# Altium footprint library ref-packages.PCBLIB: 1543 footprints (part 9 of 103)
Each footprint in its own frame and in the unit in brackets; x right, y up, seen from the top. Pads: shape width x height; smd on the part's side, far side on the other; paste and mask are expansions set on the pad; w line width, h text height; cw(c..) or ccw(c..) is an arc to the next point about the centre after c.
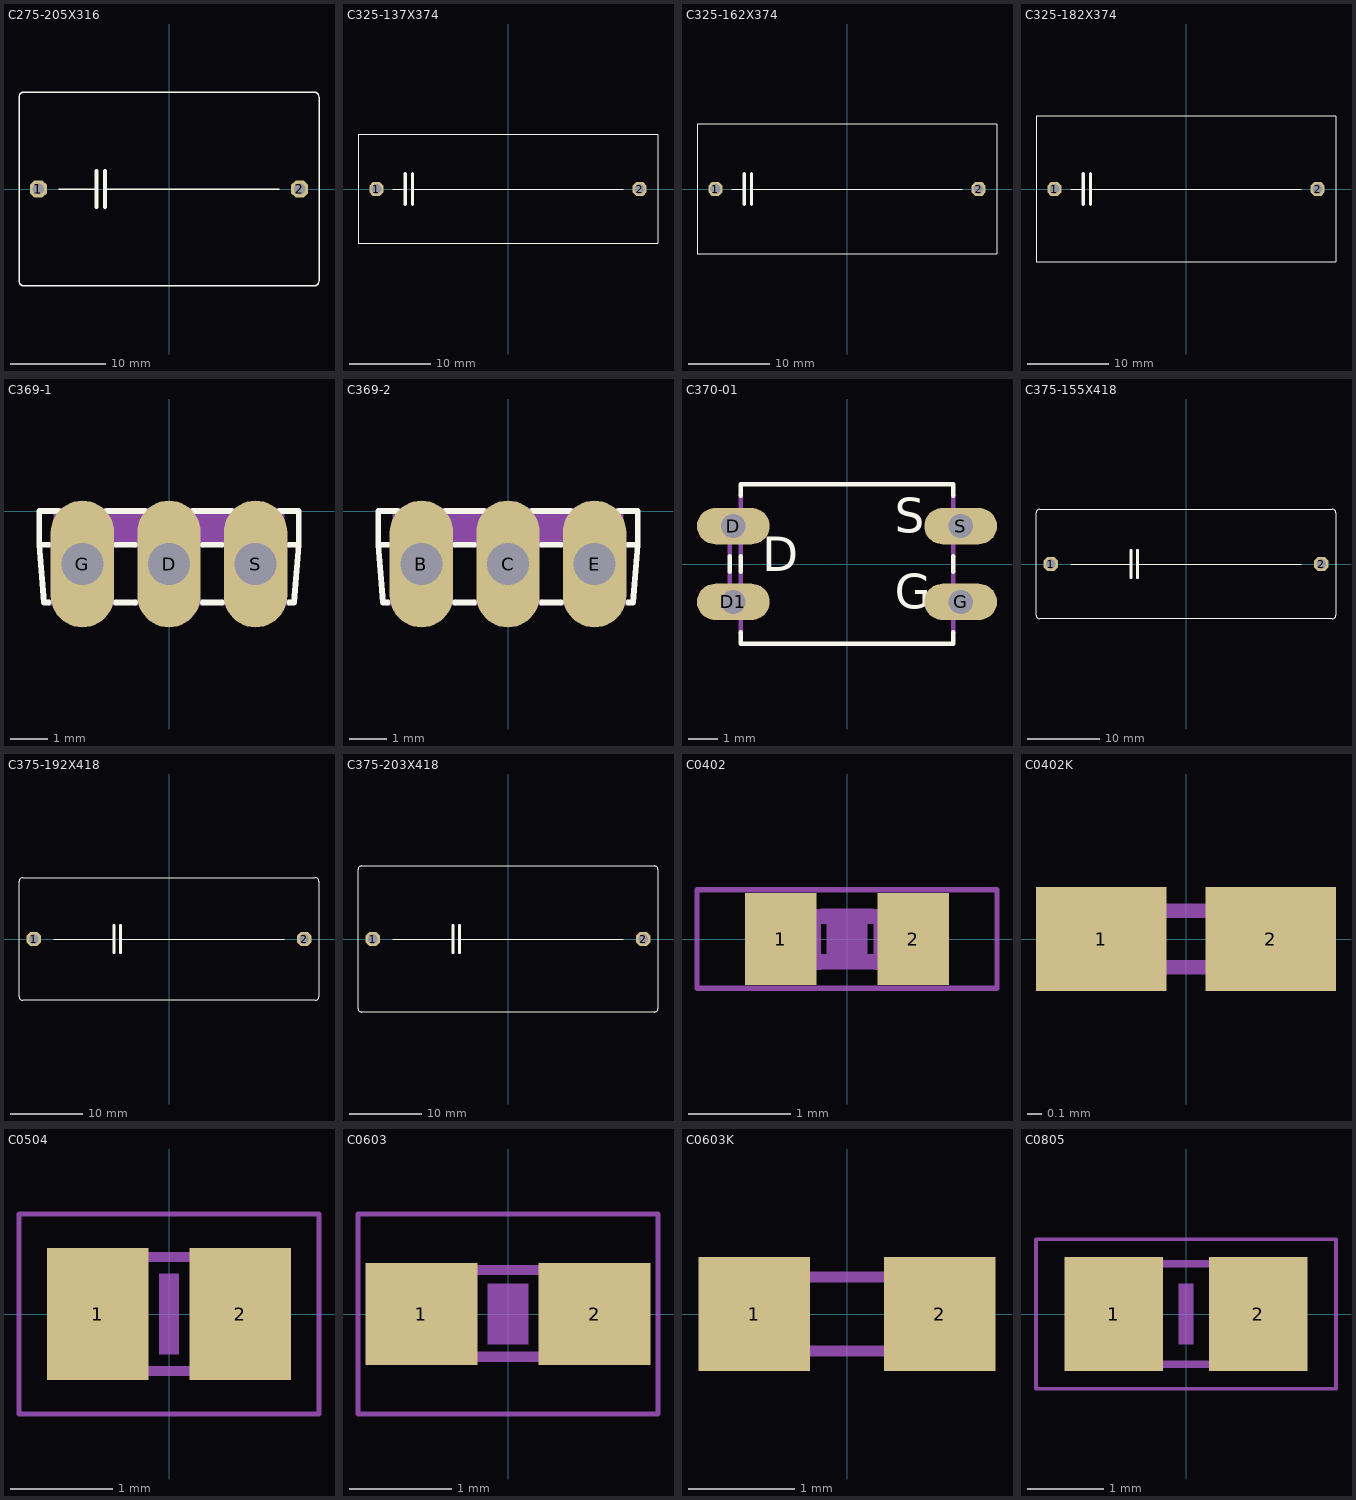
[diagram p8: the footprints below, top view; thin cyan lines are the x and y axes]

## C275-205X316 [mil]
pads (2):
  oct 70.5x70.5 hole 47: 1(-540,0) 2(540,0)
Top Overlay:
  lines w6: -455,0 -300,0 ; -265,0 455,0 ; -620,-380 -620,380 cw(c-600,380) -600,400 600,400 cw(c600,380) 620,380 620,-380 cw(c600,-380) 600,-400 -600,-400 cw(c-600,-380) -620,-380
  lines w16: -300,-75 -300,0 -300,75 ; -265,-75 -265,0 -265,75

## C325-137X374 [mil]
pads (2):
  oct 70.5x70.5 hole 47: 1(-640,0) 2(640,0)
Top Overlay:
  lines w6: -562,0 -500,0 ; -465,0 562,0 ; -730,-265 -730,265 730,265 730,-265 -730,-265
  lines w16: -500,-75 -500,0 -500,75 ; -465,-75 -465,0 -465,75

## C325-162X374 [mil]
pads (2):
  oct 70.5x70.5 hole 47: 1(-640,0) 2(640,0)
Top Overlay:
  lines w6: -562,0 -500,0 ; -465,0 562,0 ; -730,-315 -730,315 730,315 730,-315 -730,-315
  lines w16: -500,-75 -500,0 -500,75 ; -465,-75 -465,0 -465,75

## C325-182X374 [mil]
pads (2):
  oct 70.5x70.5 hole 47: 1(-640,0) 2(640,0)
Top Overlay:
  lines w6: -562,0 -500,0 ; -465,0 562,0 ; -730,-355 -730,355 730,355 730,-355 -730,-355
  lines w16: -500,-75 -500,0 -500,75 ; -465,-75 -465,0 -465,75

## C369-1 [mil]
pads (3):
  oval 66x132 hole 44: D(0,-55) G(-90,-55) S(90,-55)
Top Overlay:
  lines w6: -125,-95 -130,-95 -135,-35 ; -125,-35 -135,-35 ; -115,0 -135,0 -135,-35 ; -65,0 -25,0 ; -55,-95 -35,-95 ; -55,-35 -35,-35 ; 25,0 65,0 ; 35,-95 55,-95 ; 35,-35 55,-35 ; 115,0 135,0 135,-35 ; 125,-95 130,-95 135,-35 ; 125,-35 135,-35
Mechanical 16:
  rectangle: -120,-35 120,0
  lines w6: -125,-95 -55,-95 ; -125,-35 -55,-35 ; -115,0 -65,0 ; -35,-95 35,-95 ; -35,-35 35,-35 ; -25,0 25,0 ; 55,-95 125,-95 ; 55,-35 125,-35 ; 65,0 115,0

## C369-2 [mil]
pads (3):
  oval 66x132 hole 44: B(-90,-55) C(0,-55) E(90,-55)
Top Overlay:
  lines w6: -125,-95 -130,-95 -135,-35 ; -125,-35 -135,-35 ; -115,0 -135,0 -135,-35 ; -65,0 -25,0 ; -55,-95 -35,-95 ; -55,-35 -35,-35 ; 25,0 65,0 ; 35,-95 55,-95 ; 35,-35 55,-35 ; 115,0 135,0 135,-35 ; 125,-95 130,-95 135,-35 ; 125,-35 135,-35
Mechanical 16:
  rectangle: -120,-35 120,0
  lines w6: -125,-95 -55,-95 ; -125,-35 -55,-35 ; -115,0 -65,0 ; -35,-95 35,-95 ; -35,-35 35,-35 ; -25,0 25,0 ; 55,-95 125,-95 ; 55,-35 125,-35 ; 65,0 115,0

## C370-01 [mil]
pads (4):
  oval 96x48 hole 32: D(-150,50) D1(-150,-50) G(150,-50) S(150,50)
Top Overlay:
  lines w6: -155,-10 -155,10 ; -140,-90 -140,-105 140,-105 140,-90 ; -140,-10 -140,10 ; -140,90 -140,105 140,105 140,90 ; 140,-10 140,10
  text "D" at -112,-25 h77.5
  text "S" at 63,26 h77.5
  text "G" at 63,-74 h77.5
Mechanical 16:
  lines w6: -155,-10 -155,-65 -140,-65 ; -155,10 -155,65 -140,65 ; -140,-90 -140,-65 ; -140,-10 -140,-65 ; -140,10 -140,65 ; -140,90 -140,65 ; 140,-90 140,-65 ; 140,-10 140,-35 ; 140,10 140,35 ; 140,90 140,65 ; 140,-65 140,-35 ; 140,-65 155,-65 155,-35 140,-35 ; 140,35 140,65 ; 140,35 155,35 155,65 140,65

## C375-155X418 [mil]
pads (2):
  oct 78x78 hole 52: 1(-740,0) 2(740,0)
Top Overlay:
  lines w6: -630,0 -300,0 ; -265,0 630,0 ; -820,-280 -820,280 cw(c-800,280) -800,300 800,300 cw(c800,280) 820,280 820,-280 cw(c800,-280) 800,-300 -800,-300 cw(c-800,-280) -820,-280
  lines w16: -300,-75 -300,0 -300,75 ; -265,-75 -265,0 -265,75

## C375-192X418 [mil]
pads (2):
  oct 78x78 hole 52: 1(-740,0) 2(740,0)
Top Overlay:
  lines w6: -630,0 -300,0 ; -265,0 630,0 ; -820,-315 -820,315 cw(c-800,315) -800,335 800,335 cw(c800,315) 820,315 820,-315 cw(c800,-315) 800,-335 -800,-335 cw(c-800,-315) -820,-315
  lines w16: -300,-75 -300,0 -300,75 ; -265,-75 -265,0 -265,75

## C375-203X418 [mil]
pads (2):
  oct 78x78 hole 52: 1(-740,0) 2(740,0)
Top Overlay:
  lines w6: -630,0 -300,0 ; -265,0 630,0 ; -820,-380 -820,380 cw(c-800,380) -800,400 800,400 cw(c800,380) 820,380 820,-380 cw(c800,-380) 800,-400 -800,-400 cw(c-800,-380) -820,-380
  lines w16: -300,-75 -300,0 -300,75 ; -265,-75 -265,0 -265,75

## C0402 [mm]
pads (2):
  rect 0.7x0.9 smd: 1(-0.65,0) 2(0.65,0)
Mechanical 6:
  rectangle: -0.2,-0.3 0.2,0.3
Mechanical 16:
  rectangle: -0.554,-0.305 -0.254,0.295
  rectangle: 0.259,-0.305 0.559,0.295
  lines w0.152: -0.245,-0.224 0.245,-0.224 ; -0.245,0.224 0.245,0.224
Mechanical 27:
  lines w0.051: -1.473,-0.483 1.473,-0.483 1.473,0.483 -1.473,0.483 -1.473,-0.483

## C0402K [mil]
pads (2):
  rect 36.42x29.13 smd: 1(-23.62,0) 2(23.62,0)
Mechanical 16:
  rectangle: -19.69,-9.84 -8.86,9.84
  rectangle: 8.86,-9.84 19.69,9.84
  lines w4: -16.73,-7.87 16.73,-7.87 ; -16.73,7.87 16.73,7.87

## C0504 [mm]
pads (2):
  rect 1x1.3 smd: 1(-0.7,0) 2(0.7,0)
Mechanical 6:
  rectangle: -0.1,-0.4 0.1,0.4
Mechanical 16:
  rectangle: -0.66,-0.622 -0.28,0.628
  rectangle: 0.279,-0.622 0.659,0.628
  lines w0.102: -0.294,-0.559 0.294,-0.559 ; -0.294,0.559 0.294,0.559
Mechanical 27:
  lines w0.051: -1.473,-0.983 1.473,-0.983 1.473,0.983 -1.473,0.983 -1.473,-0.983

## C0603 [mm]
pads (2):
  rect 1.1x1 smd: 1(-0.85,0) 2(0.85,0)
Mechanical 6:
  rectangle: -0.2,-0.3 0.2,0.3
Mechanical 16:
  rectangle: -0.838,-0.47 -0.338,0.48
  rectangle: 0.33,-0.47 0.83,0.48
  lines w0.102: -0.356,-0.419 0.356,-0.419 ; -0.356,0.432 0.356,0.432
Mechanical 27:
  lines w0.051: -1.473,-0.983 1.473,-0.983 1.473,0.983 -1.473,0.983 -1.473,-0.983

## C0603K [mm]
pads (2):
  rect 1.05x1.08 smd: 1(-0.875,0) 2(0.875,0)
Mechanical 16:
  rectangle: -0.8,-0.4 -0.45,0.4
  rectangle: 0.45,-0.4 0.8,0.4
  lines w0.102: -0.725,-0.35 0.725,-0.35 ; -0.725,0.35 0.725,0.35

## C0805 [mil]
pads (2):
  rect 51.18x59.06 smd: 1(-37.4,0) 2(37.4,0)
Mechanical 6:
  rectangle: -3.94,-15.75 3.94,15.75
Mechanical 16:
  rectangle: -43,-28.5 -13.47,28.59
  rectangle: 14,-28.5 43.53,28.59
  lines w4: -15,25.98 15,25.98 ; -14.02,-25.98 15,-25.98
Mechanical 27:
  lines w2: -77.68,-38.7 77.68,-38.7 77.68,38.7 -77.68,38.7 -77.68,-38.7